# Altium footprint library My Footprint 3D.PCBLIB: 447 footprints (part 3 of 29)
Each footprint in its own frame and in the unit in brackets; x right, y up, seen from the top. Pads: shape width x height; smd on the part's side, far side on the other; paste and mask are expansions set on the pad; w line width, h text height; cw(c..) or ccw(c..) is an arc to the next point about the centre after c.
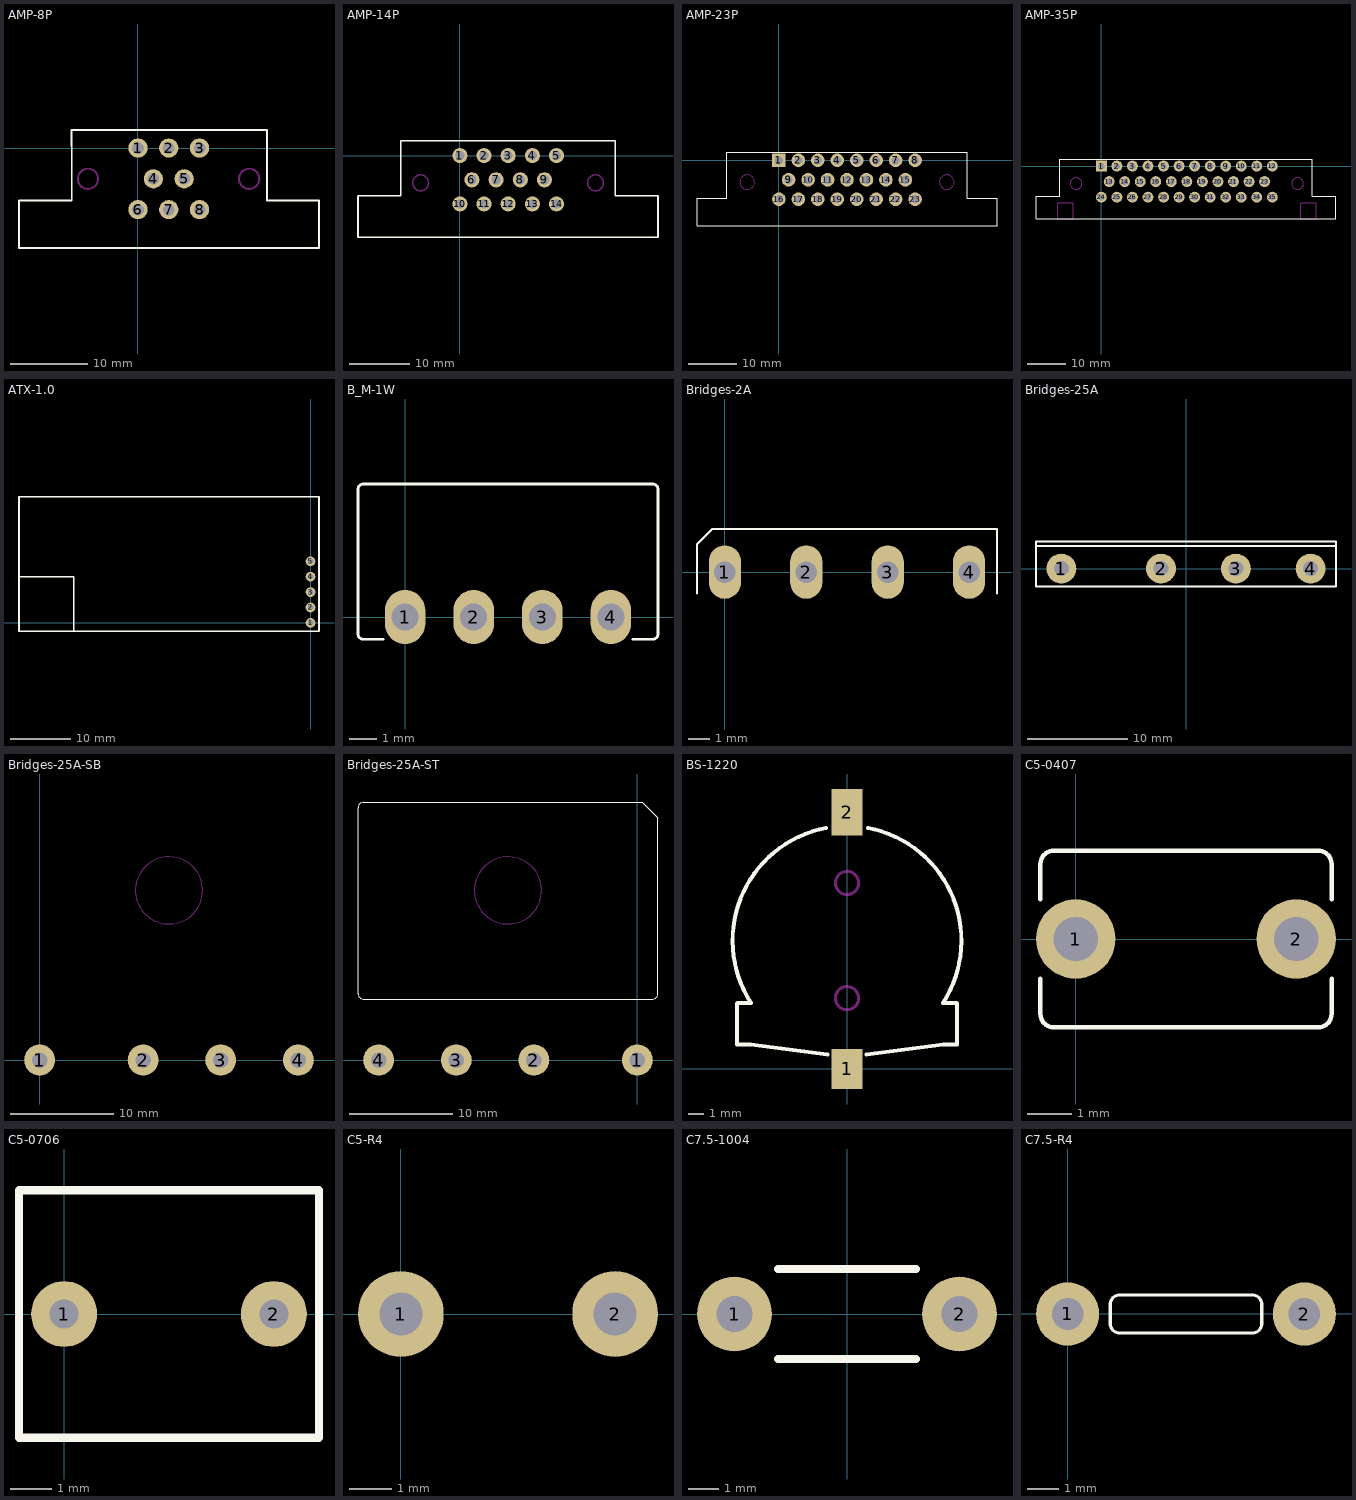
[diagram p2: the footprints below, top view; thin cyan lines are the x and y axes]

## AMP-8P [mm]
pads (8):
  round 2.5 hole 1.5: 1(0,0) 2(4,0) 3(8,0) 4(2,-4) 5(6,-4) 6(0,-8) 7(4,-8) 8(8,-8)
Top Overlay:
  lines w0.254: -15.463,-12.992 -15.463,-6.794 -8.605,-6.794 -8.605,-1.968 -8.636,2.337 -4.668,2.35 12.858,2.35 16.789,2.337 16.795,-1.968 16.795,-6.794 23.526,-6.794 23.526,-12.992 -15.463,-12.992
Keep-Out Layer:
  lines w0.254: -7.335,-2.984 ccw(c-6.5,-4) -5.185,-4 ccw(c-6.5,-4) -7.335,-2.984 ; 13.62,-2.984 cw(c14.455,-4) 15.77,-4 cw(c14.455,-4) 13.62,-2.984

## AMP-14P [mm] "AMP-14PIN"
pads (14):
  round 2.5 hole 1.5: 1(0,0) 2(4,0) 3(8,0) 4(12,0) 5(16,0) 6(2,-4) 7(6,-4) 8(10,-4) 9(14,-4) 10(0,-8) 11(4,-8) 12(8,-8) 13(12,-8) 14(16,-8)
Top Overlay:
  lines w0.254: -16.86,-13.525 -16.86,-6.794 ; -16.86,-6.667 -9.748,-6.667 -9.748,-1.841 -9.748,2.47 25.685,2.47 25.685,-6.667 ; -16.829,-13.525 32.797,-13.525 32.797,-6.667 25.685,-6.667 ; 22.5,-13.515 22.51,-13.525 ; 25.685,-1.841 25.685,-6.667
Keep-Out Layer:
  lines w0.254: -7.335,-3.492 cw(c-6.5,-4.508) -5.185,-4.508 cw(c-6.5,-4.508) -7.335,-3.492 ; 21.621,-3.492 cw(c22.456,-4.508) 23.771,-4.508 cw(c22.456,-4.508) 21.621,-3.492

## AMP-23P [mil]
pads (23):
  rect 110x110 hole 65: 1(0,0)
  round 110 hole 65: 2(157.48,0) 3(314.96,0) 4(472.44,0) 5(629.92,0) 6(787.4,0) 7(944.88,0) 8(1102.36,0) 9(78.74,-157.48) 10(236.22,-157.48) 11(393.7,-157.48) 12(551.18,-157.48) 13(708.66,-157.48) 14(866.14,-157.48) 15(1023.62,-157.48) 16(0,-314.96) 17(157.48,-314.96) 18(314.96,-314.96) 19(472.44,-314.96) 20(629.92,-314.96) 21(787.4,-314.96) 22(944.88,-314.96) 23(1102.36,-314.96)
Top Overlay:
  lines w5: -662.2,-531.5 -662.2,-307.09 -422.05,-307.09 -422.05,66.93 1524.41,66.93 1524.41,-307.09 1764.57,-307.09 1764.57,-531.5 -662.2,-531.5
Keep-Out Layer:
  circle w10: c1358.27,-177.17 r59.05
  circle w10: c-255.91,-177.17 r59.05
3D body "c-776087-1-l-3d.stp": height 1096.46, standoff -167.32, extent -643.85,-1407.19 1749.85,81

## AMP-35P [mil]
pads (35):
  rect 110x110 hole 65: 1(0,0)
  round 110 hole 65: 2(157.48,0) 3(314.96,0) 4(472.44,0) 5(629.92,0) 6(787.4,0) 7(944.88,0) 8(1102.36,0) 9(1259.84,0) 10(1417.32,0) 11(1574.8,0) 12(1732.28,0) 13(78.74,-157.48) 14(236.22,-157.48) 15(393.7,-157.48) 16(551.18,-157.48) 17(708.66,-157.48) 18(866.14,-157.48) 19(1023.62,-157.48) 20(1181.1,-157.48) 21(1338.58,-157.48) 22(1496.06,-157.48) 23(1653.54,-157.48) 24(0,-314.96) 25(157.48,-314.96) 26(314.96,-314.96) 27(472.44,-314.96) 28(629.92,-314.96) 29(787.4,-314.96) 30(944.88,-314.96) 31(1102.36,-314.96) 32(1259.84,-314.96) 33(1417.32,-314.96) 34(1574.8,-314.96) 35(1732.28,-314.96)
Top Overlay:
  lines w5: -662.2,-531.5 -662.2,-307.09 -422.05,-307.09 -422.05,66.93 2137.01,66.93 2137.01,-307.09 2377.17,-307.09 2377.17,-531.5 -662.2,-531.5
Keep-Out Layer:
  lines w10: -440.95,-531.5 -283.47,-531.5 -283.47,-374.02 -440.95,-374.02 -440.95,-531.5 ; -255.91,-236.22 cw(c-255.91,-177.17) -255.91,-118.11 cw(c-255.91,-177.17) -255.91,-236.22 ; 1988.19,-236.22 cw(c1988.19,-177.17) 1988.19,-118.11 cw(c1988.19,-177.17) 1988.19,-236.22 ; 2019.68,-531.5 2177.16,-531.5 2177.16,-374.02 2019.68,-374.02 2019.68,-531.5

## ATX-1.0 [mm]
pads (5):
  round 1.6 hole 0.9: 1(0,0) 2(0,2.54) 3(0,5.08) 4(0,7.62) 5(0,10.16)
Top Overlay:
  lines w0.254: -48.133,7.62 -39.116,7.62 -39.116,-1.397 ; -48.133,-1.397 1.397,-1.397 1.397,20.828 -48.133,20.828 -48.133,-1.397

## B_M-1W [mm]
pads (4):
  oval 1.5x2 hole 1: 1(0,0) 2(2.54,0) 3(5.08,0) 4(7.62,0)
Top Overlay:
  lines w0.1: -0.815,-0.825 -1.54,-0.825 cw(c-1.54,-0.625) -1.74,-0.625 -1.74,4.725 cw(c-1.54,4.725) -1.54,4.925 9.16,4.925 cw(c9.16,4.725) 9.36,4.725 9.36,-0.625 cw(c9.16,-0.625) 9.16,-0.825 8.435,-0.825
3D body: height 7, standoff 0, extent -1.94,-1 9.56,5.1
3D body: height 1, standoff -1.5, extent -0.4,-0.15 0.4,0.15
3D body: height 1, standoff -1.5, extent 2.14,-0.15 2.94,0.15
3D body: height 1, standoff -1.5, extent 4.68,-0.15 5.48,0.15
3D body: height 1, standoff -1.5, extent 7.22,-0.15 8.02,0.15

## Bridges-2A [mm]
pads (4):
  oval 1.5x2.5 hole 1: 1(0,0) 2(3.8,0) 3(7.6,0) 4(11.4,0)
Top Overlay:
  lines w0.1: -1.3,-1 -1.3,1.3 -0.6,2 12.7,2 12.7,-1
3D body: height 13, standoff 1.5, extent -1.7,-1.3 13.1,2.5
3D body: height 2, standoff -2, extent 11.002,-0.399 11.8,0.4
3D body: height 2, standoff -2, extent 7.202,-0.399 8,0.4
3D body: height 2, standoff -2, extent 3.402,-0.399 4.2,0.4
3D body: height 2, standoff -2, extent -0.398,-0.399 0.4,0.4

## Bridges-25A [mm]
pads (4):
  round 3 hole 1.5: 1(-12.5,0) 2(-2.5,0) 3(5,0) 4(12.5,0)
Top Overlay:
  lines w0.2: -15.04,2.286 15.04,2.286 ; -15.04,-1.778 -15.04,2.7 15.04,2.7 15.04,-1.778 -15.04,-1.778
3D body: height 5, standoff 1, extent 11.45,-0.4 13.55,0.4
3D body: height 3, standoff -2, extent 12,-0.4 13,0.4
3D body: height 5, standoff 1, extent 3.95,-0.4 6.05,0.4
3D body: height 3, standoff -2, extent 4.5,-0.4 5.5,0.4
3D body: height 5, standoff 1, extent -3.55,-0.4 -1.45,0.4
3D body: height 3, standoff -2, extent -3,-0.4 -2,0.4
3D body: height 5, standoff 1, extent -13.55,-0.4 -11.45,0.4
3D body: height 3, standoff -2, extent -13,-0.4 -12,0.4
3D body: height 25, standoff 5, extent -15,-0.4 15,3.2
3D body: height 17.6, standoff 14.4, extent -1.587,-0.425 1.6,3.225
3D body: height 10, standoff 5, extent -15,-1.8 15,3.2

## Bridges-25A-SB [mm]
pads (4):
  round 3 hole 1.5: 1(0,0) 2(10,0) 3(17.5,0) 4(25,0)
Bottom Overlay:
  lines w0.1: -2,6.4 ccw(c-1.5,6.4) -1.5,5.9 3.7,5.9 26.5,5.9 ccw(c26.5,6.4) 27,6.4 27,24.4 ccw(c26.5,24.4) 26.5,24.9 -0.5,24.9 -2,23.4 -2,6.4
Keep-Out Layer:
  circle w0.1: c12.5,16.4 r3.25
3D body: height 1.9, standoff 1.2, extent -0.5,0.35 0.5,2
3D body: height 1.9, standoff 1.2, extent -1.1,1.4 1.1,5.4
3D body: height 4.61, standoff 0.99, extent 10.9,14.803 14.087,17.997
3D body: height 1, standoff 0, extent -2.5,5.39 27.5,10.4
3D body: height 4.6, standoff 1, extent -2.5,5.4 27.5,25.4
3D body: height 1.9, standoff -2, extent -0.5,-0.35 0.5,0.35
3D body: height 1.9, standoff -2, extent 9.5,-0.35 10.5,0.35
3D body: height 1.9, standoff 1.2, extent 8.9,1.4 11.1,5.4
3D body: height 1.9, standoff 1.2, extent 9.5,0.35 10.5,2
3D body: height 1.9, standoff -2, extent 17,-0.35 18,0.35
3D body: height 1.9, standoff 1.2, extent 16.4,1.4 18.6,5.4
3D body: height 1.9, standoff 1.2, extent 17,0.35 18,2
3D body: height 1.9, standoff -2, extent 24.5,-0.35 25.5,0.35
3D body: height 1.9, standoff 1.2, extent 23.9,1.4 26.1,5.4
3D body: height 1.9, standoff 1.2, extent 24.5,0.35 25.5,2

## Bridges-25A-ST [mm]
pads (4):
  round 3 hole 1.5: 1(0,0) 2(-10,0) 3(-17.5,0) 4(-25,0)
Top Overlay:
  lines w0.1: -27,6.4 ccw(c-26.5,6.4) -26.5,5.9 -3.7,5.9 1.5,5.9 ccw(c1.5,6.4) 2,6.4 2,23.4 0.5,24.9 -26.5,24.9 ccw(c-26.5,24.4) -27,24.4 -27,6.4
Keep-Out Layer:
  circle w0.1: c-12.5,16.4 r3.25
3D body: height 1.9, standoff 1.2, extent -25.5,0.35 -24.5,2
3D body: height 1.9, standoff 1.2, extent -26.1,1.4 -23.9,5.4
3D body: height 1.9, standoff -2, extent -25.5,-0.35 -24.5,0.35
3D body: height 1.9, standoff 1.2, extent -18,0.35 -17,2
3D body: height 1.9, standoff 1.2, extent -18.6,1.4 -16.4,5.4
3D body: height 1.9, standoff -2, extent -18,-0.35 -17,0.35
3D body: height 1.9, standoff 1.2, extent -10.5,0.35 -9.5,2
3D body: height 1.9, standoff 1.2, extent -11.1,1.4 -8.9,5.4
3D body: height 1.9, standoff -2, extent -10.5,-0.35 -9.5,0.35
3D body: height 1.9, standoff -2, extent -0.5,-0.35 0.5,0.35
3D body: height 4.6, standoff 1, extent -27.5,5.4 2.5,25.4
3D body: height 1, standoff 0, extent -27.5,5.39 2.5,10.4
3D body: height 4.61, standoff 0.99, extent -14.1,14.803 -10.913,17.997
3D body: height 1.9, standoff 1.2, extent -1.1,1.4 1.1,5.4
3D body: height 1.9, standoff 1.2, extent -0.5,0.35 0.5,2

## BS-1220 [mm]
height 4
pads (2):
  rect 2x2.6 smd: 1(0,0)
  rect 2x3 smd: 2(0,16.6)
Top Overlay:
  lines w0.254: -7.112,4.236 -7.112,1.569 -6.223,1.569 -1.27,0.934 ; -7.094,4.254 -6.196,4.254 cw(c0,8.3) -1.364,15.573 ; 1.27,0.934 6.223,1.569 7.112,1.569 7.112,4.236 ; 1.364,15.573 cw(c0,8.3) 6.196,4.254 7.094,4.254
Keep-Out Layer:
  circle w0.2: c0,12.025 r0.75
  circle w0.2: c0,4.575 r0.75

## C5-0407 [mm] "Body 4.5X7.2"
height 6
pads (2):
  round 1.8 hole 1: 1(0,0) 2(5,0)
Top Overlay:
  lines w0.1: -0.8,-0.9 -0.8,-1.7 ccw(c-0.5,-1.7) -0.5,-2 5.5,-2 ccw(c5.5,-1.7) 5.8,-1.7 5.8,-0.9 ; -0.8,0.9 -0.8,1.7 cw(c-0.5,1.7) -0.5,2 5.5,2 cw(c5.5,1.7) 5.8,1.7 5.8,0.9
3D body: height 0.2, standoff 0, extent 3.275,2.05 5.275,2.25
3D body: height 0.2, standoff 0, extent -0.275,2.05 1.725,2.25
3D body: height 0.2, standoff 0, extent 3.275,-2.25 5.275,-2.05
3D body: height 0.2, standoff 0, extent -0.275,-2.25 1.725,-2.05
3D body: height 6, standoff 0.2, extent -1.1,-2.25 6.1,2.25
3D body: height 0, standoff -2, extent 4.603,-0.399 5.4,0.399
3D body: height 0, standoff -2, extent -0.397,-0.399 0.4,0.399

## C5-0706 [mm] "Body 7.2X6.0mm"
pads (2):
  round 1.6 hole 0.7: 1(0,0) 2(5.08,0)
Top Overlay:
  lines w0.2: -1.095,-3 0,-3 5.08,-3 6.175,-3 6.175,3 5.08,3 0,3 -1.095,3 -1.095,-3

## C5-R4 [mm]
pads (2):
  round 2 hole 1: 1(0,0) 2(5,0)
3D body: height 4.76, standoff 0.38, extent 1.119,-0.599 5.5,0.599
3D body: height 1, standoff -2, extent 4.7,-0.3 5.297,0.299
3D body: height 1.2, standoff 0.4, extent 4.4,-0.599 5.595,0.599
3D body: height 1.2, standoff 0.4, extent -0.595,-0.599 0.6,0.599
3D body: height 1, standoff -2, extent -0.298,-0.299 0.3,0.3
3D body: height 4.76, standoff 0.38, extent -0.5,-0.599 3.881,0.599
3D body: height 6.5, standoff 1.5, extent -0.224,-1.75 5.14,1.833

## C7.5-1004 [mm]
pads (2):
  round 2.5 hole 1.2: 1(-3.75,0) 2(3.75,0)
Top Overlay:
  lines w0.254: -2.3,-1.5 2.3,-1.5 ; -2.3,1.5 2.3,1.5
3D body: height 8.8, standoff 4.8, extent -5,-2 5,2
3D body: height 6.8, standoff 2.2, extent -5,-2 5,2
3D body: height 4.5, standoff 0.5, extent -5,-2 5,2
3D body: height 0.5, standoff -2, extent -4.156,-0.399 -3.36,0.399
3D body: height 0, standoff -2, extent 3.353,-0.399 4.15,0.399

## C7.5-R4 [mm]
pads (2):
  round 2 hole 1: 1(0,0) 2(7.5,0)
Top Overlay:
  lines w0.1: 1.65,-0.6 ccw(c1.65,-0.6) 1.65,-0.6 ; 1.65,-0.6 1.65,-0.6 cw(c1.65,-0.3) 1.35,-0.3 1.35,0.3 cw(c1.65,0.3) 1.65,0.6 5.85,0.6 ; 1.65,-0.6 5.85,-0.6 ccw(c5.85,-0.3) 6.15,-0.3 6.15,0.3 ccw(c5.85,0.3) 5.85,0.6 ; 5.85,0.6 ccw(c5.85,0.6) 5.85,0.6
3D body: height 6.5, standoff 1.5, extent 1.126,-1.752 6.49,1.831
3D body: height 4.76, standoff 0.38, extent -0.5,-0.599 3.881,0.599
3D body: height 1, standoff -2, extent -0.298,-0.299 0.3,0.3
3D body: height 1.2, standoff 0.4, extent -0.595,-0.599 0.6,0.599
3D body: height 1.2, standoff 0.4, extent 6.9,-0.599 8.095,0.599
3D body: height 1, standoff -2, extent 7.2,-0.299 7.798,0.299
3D body: height 4.76, standoff 0.38, extent 3.619,-0.599 8,0.599